# Altium footprint library Maxwell_LIB.PcbLib: 143 footprints (part 5 of 9)
Each footprint in its own frame and in the unit in brackets; x right, y up, seen from the top. Pads: shape width x height; smd on the part's side, far side on the other; paste and mask are expansions set on the pad; w line width, h text height; cw(c..) or ccw(c..) is an arc to the next point about the centre after c.
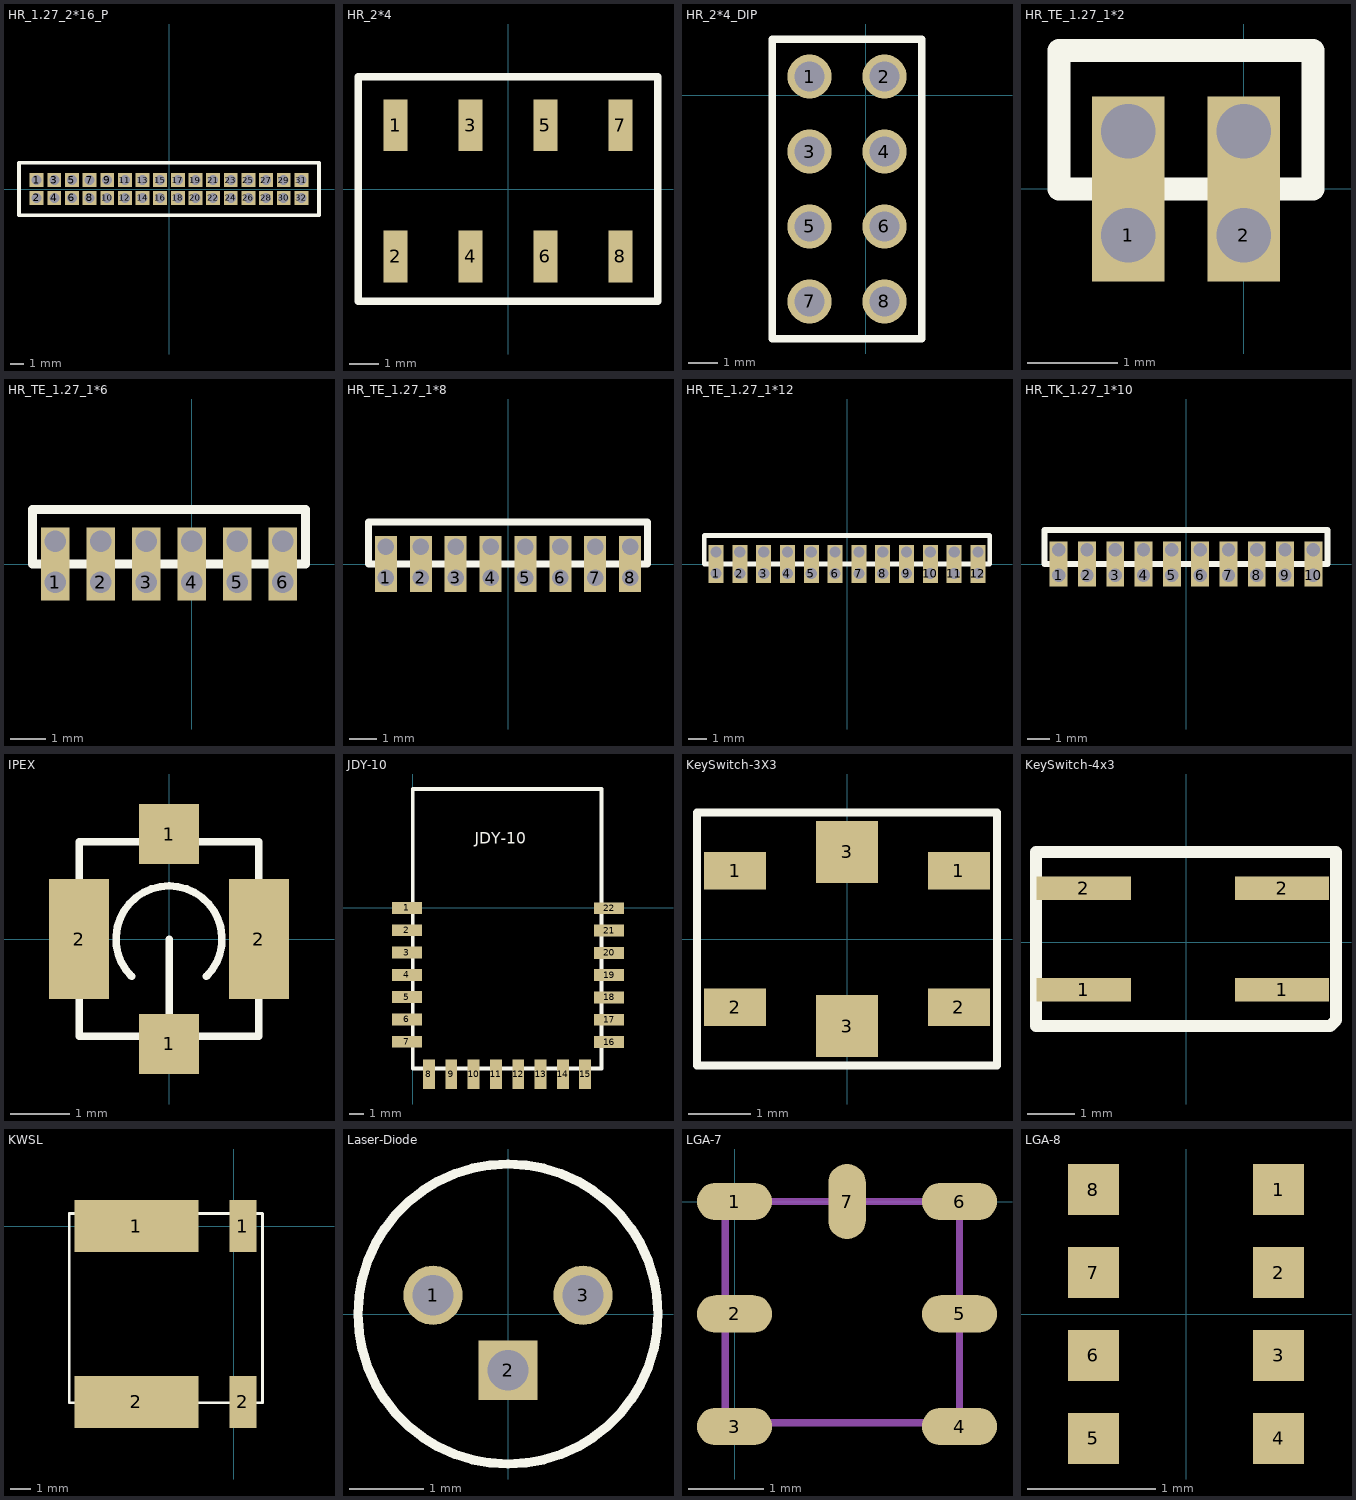
[diagram p4: the footprints below, top view; thin cyan lines are the x and y axes]

## HR_1.27_2*16_P [mm]
pads (32):
  rect 1x1 hole 0.72: 1(-9.525,0.635) 2(-9.525,-0.635) 3(-8.255,0.635) 4(-8.255,-0.635) 5(-6.985,0.635) 6(-6.985,-0.635) 7(-5.715,0.635) 8(-5.715,-0.635) 9(-4.445,0.635) 10(-4.445,-0.635) 11(-3.175,0.635) 12(-3.175,-0.635) 13(-1.905,0.635) 14(-1.905,-0.635) 15(-0.635,0.635) 16(-0.635,-0.635) 17(0.635,0.635) 18(0.635,-0.635) 19(1.905,0.635) 20(1.905,-0.635) 21(3.175,0.635) 22(3.175,-0.635) 23(4.445,0.635) 24(4.445,-0.635) 25(5.715,0.635) 26(5.715,-0.635) 27(6.985,0.635) 28(6.985,-0.635) 29(8.255,0.635) 30(8.255,-0.635) 31(9.525,0.635) 32(9.525,-0.635)
Top Overlay:
  lines w0.254: -10.795,-1.905 3.175,-1.905 10.795,-1.905 10.795,1.905 3.175,1.905 -10.795,1.905 -10.795,-1.905
3D body "1.27-2x16.stp": height 5.5, standoff -2.35, extent -10.16,-1.7 10.16,1.7

## HR_2*4 [mil]
pads (8):
  rect 32.01x69.06 smd: 1(-150,85) 2(-150,-90) 3(-50,85) 4(-50,-90) 5(50,85) 6(50,-90) 7(150,85) 8(150,-90)
Top Overlay:
  lines w10: -200,-150 200,-150 200,150 -200,150 -200,-150

## HR_2*4_DIP [mm]
pads (8):
  round 1.5 hole 1: 1(-1.905,0.635) 2(0.635,0.635) 3(-1.905,-1.905) 4(0.635,-1.905) 5(-1.905,-4.445) 6(0.635,-4.445) 7(-1.905,-6.985) 8(0.635,-6.985)
Top Overlay:
  lines w0.254: -3.175,-8.255 1.905,-8.255 1.905,1.905 -3.175,1.905 -3.175,-8.255

## HR_TE_1.27_1*2 [mm]
pads (4):
  rect 0.8x2.032 hole 0.6 copper offset 0,0.508: 1(-1.27,-0.508) 2(0,-0.508)
  rect 0x0 hole 0.6: 1(-1.27,0.635) 2(0,0.635)
Top Overlay:
  lines w0.254: -2.032,0 -2.032,1.524 0.762,1.524 0.762,0 -2.032,0

## HR_TE_1.27_1*6 [mm]
pads (12):
  rect 0.8x2.032 hole 0.6 copper offset 0,0.508: 1(-3.81,-0.508) 2(-2.54,-0.508) 3(-1.27,-0.508) 4(0,-0.508) 5(1.27,-0.508) 6(2.54,-0.508)
  rect 0x0 hole 0.6: 1(-3.81,0.635) 2(-2.54,0.635) 3(-1.27,0.635) 4(0,0.635) 5(1.27,0.635) 6(2.54,0.635)
Top Overlay:
  lines w0.254: -4.445,0 -4.445,1.524 3.175,1.524 3.175,0 -4.445,0

## HR_TE_1.27_1*8 [mm]
pads (16):
  rect 0.8x2.032 hole 0.6 copper offset 0,0.508: 1(-4.445,-0.508) 2(-3.175,-0.508) 3(-1.905,-0.508) 4(-0.635,-0.508) 5(0.635,-0.508) 6(1.905,-0.508) 7(3.175,-0.508) 8(4.445,-0.508)
  rect 0x0 hole 0.6: 1(-4.445,0.635) 2(-3.175,0.635) 3(-1.905,0.635) 4(-0.635,0.635) 5(0.635,0.635) 6(1.905,0.635) 7(3.175,0.635) 8(4.445,0.635)
Top Overlay:
  lines w0.254: 1.524,1.524 5.08,1.524 5.08,0 2.54,0 -5.08,0 -5.08,1.524 2.54,1.524

## HR_TE_1.27_1*12 [mm]
pads (24):
  rect 0.8x2.032 hole 0.6 copper offset 0,0.508: 1(-6.985,-0.508) 2(-5.715,-0.508) 3(-4.445,-0.508) 4(-3.175,-0.508) 5(-1.905,-0.508) 6(-0.635,-0.508) 7(0.635,-0.508) 8(1.905,-0.508) 9(3.175,-0.508) 10(4.445,-0.508) 11(5.715,-0.508) 12(6.985,-0.508)
  rect 0x0 hole 0.6: 1(-6.985,0.635) 2(-5.715,0.635) 3(-4.445,0.635) 4(-3.175,0.635) 5(-1.905,0.635) 6(-0.635,0.635) 7(0.635,0.635) 8(1.905,0.635) 9(3.175,0.635) 10(4.445,0.635) 11(5.715,0.635) 12(6.985,0.635)
Top Overlay:
  lines w0.254: -1.016,1.524 7.62,1.524 7.62,0 0,0 -7.62,0 -7.62,1.524 0,1.524

## HR_TK_1.27_1*10 [mm]
pads (20):
  rect 0.8x2.032 hole 0.6 copper offset 0,0.508: 1(-5.715,-0.508) 2(-4.445,-0.508) 3(-3.175,-0.508) 4(-1.905,-0.508) 5(-0.635,-0.508) 6(0.635,-0.508) 7(1.905,-0.508) 8(3.175,-0.508) 9(4.445,-0.508) 10(5.715,-0.508)
  rect 0x0 hole 0.6: 1(-5.715,0.635) 2(-4.445,0.635) 3(-3.175,0.635) 4(-1.905,0.635) 5(-0.635,0.635) 6(0.635,0.635) 7(1.905,0.635) 8(3.175,0.635) 9(4.445,0.635) 10(5.715,0.635)
Top Overlay:
  lines w0.254: 0.254,1.524 6.35,1.524 6.35,0 1.27,0 -6.35,0 -6.35,1.524 1.27,1.524

## IPEX [mil]
pads (4):
  rect 40x40 smd: 1(0,-70) 1(0,70)
  rect 40x80 smd: 2(-60,0) 2(60,0)
Top Overlay:
  lines w5: -25,-25 cw(c0,0) 25,-25 ; 0,-65 0,0 ; -60,-65 -60,65 60,65 60,-65 -60,-65
3D body "User Library-IPEX.STEP": height 49.21, standoff -0.39, extent -59.06,-61.02 59.05,61.03

## JDY-10 [mm]
pads (22):
  rect 2x0.8 smd: 1(-0.381,0) 2(-0.381,-1.5) 3(-0.381,-3) 4(-0.381,-4.5) 5(-0.381,-6) 6(-0.381,-7.5) 7(-0.381,-9) 16(13.208,-9.017) 17(13.208,-7.517) 18(13.208,-6.017) 19(13.208,-4.517) 20(13.208,-3.017) 21(13.208,-1.517) 22(13.208,-0.017)
  rect 0.8x2 smd: 8(1.1,-11.176) 9(2.6,-11.176) 10(4.1,-11.176) 11(5.6,-11.176) 12(7.1,-11.176) 13(8.6,-11.176) 14(10.1,-11.176) 15(11.6,-11.176)
Top Overlay:
  lines w0.254: 0,-10.795 12.7,-10.795 12.7,8.001 0,8.001 0,-9.525 0,-10.795
  text "JDY-10" at 4.191,4.318 h0.76
3D body "JDY-10.STEP": height 1.45, standoff 0, extent -0.127,-10.493 12.873,8.207

## KeySwitch-3X3 [mm]
pads (6):
  rect 1x0.6 smd: 1(-1.8,1.1) 1(1.8,1.1) 2(-1.8,-1.1) 2(1.8,-1.1)
  rect 1x1 smd: 3(0,-1.4) 3(0,1.4)
Top Overlay:
  lines w0.127: -2.413,-2.032 -2.413,2.032 2.413,2.032 2.413,-2.032 -2.413,-2.032
3D body: height 0.8, standoff 0, extent -1.549,-1.549 1.549,1.549
3D body: height 1.3, standoff 1, extent -0.899,-0.9 0.9,0.9
3D body: height 0.2, standoff 0, extent 1.549,0.699 2.057,1.486
3D body: height 0.2, standoff 0, extent -2.057,0.686 -1.549,1.473
3D body: height 0.2, standoff 0, extent 1.549,-1.486 2.057,-0.698
3D body: height 0.2, standoff 0, extent -2.057,-1.486 -1.549,-0.698
3D body: height 1, standoff 0.8, extent -1.372,-1.651 1.346,1.651
3D body: height 0.8, standoff 0, extent -1.346,1.549 1.346,1.651
3D body: height 0.8, standoff 0, extent -1.372,-1.651 1.321,-1.549

## KeySwitch-4x3 [mm]
pads (4):
  rect 2x0.5 smd: 1(-2.168,-1.007) 1(2.032,-1.007) 2(-2.168,1.143) 2(2.032,1.143)
Top Overlay:
  lines w0.254: -3.175,-1.778 3.048,-1.778 3.175,-1.651 3.175,1.905 -3.175,1.905 -3.175,-1.778
3D body: height 2, standoff 0, extent -2.032,-1.778 2.032,1.905
3D body: height 3, standoff 2, extent -0.999,-0.936 1,1.063

## KWSL [mm]
pads (4):
  rect 6x2.5 smd: 1(-4.7,0) 2(-4.7,-8.5)
  rect 1.3x2.5 smd: 1(0.45,0) 2(0.45,-8.5)
Top Overlay:
  lines w0.127: -7.95,-8.534 1.397,-8.534 1.397,0.381 1.397,0.61 -7.95,0.61 -7.95,-8.534
3D body "User Library-WSL3637.STEP": height 0.64, standoff 0, extent -7.977,-8.534 1.423,0.606

## Laser-Diode [mm]
pads (3):
  round 0.8 hole 0.55: 1(-1.016,0.254) 3(1.016,0.254)
  rect 0.8x0.8 hole 0.55: 2(0,-0.762)
Top Overlay:
  circle w0.127: c0,0 r2.032
3D body "User Library-TO18 Laser Diode.STEP": height 3.5, standoff -0.5, extent -2.765,-2.775 2.8,2.775

## LGA-7 [mm]
pads (7):
  oval 1x0.5 smd: 1(0,0) 2(0,-1.5) 3(0,-3) 4(3,-3) 5(3,-1.5) 6(3,0)
  oval 0.5x1 smd: 7(1.5,0)
Mechanical 13:
  lines w0.1: -0.126,-2.948 -0.126,0 3,0 3,-2.948 -0.126,-2.948
3D body: height 0.9, standoff 0.02, extent -0.1,-3 2.95,0.05

## LGA-8 [mm]
pads (8):
  rect 0.4x0.4 smd: 1(0.725,0.975) 2(0.725,0.325) 3(0.725,-0.325) 4(0.725,-0.975) 5(-0.725,-0.975) 6(-0.725,-0.325) 7(-0.725,0.325) 8(-0.725,0.975)
3D body "User Library-LGA8-3x3mm.STEP": height 0.93, standoff 0, extent -1.5,-1.5 1.5,1.5